# Altium schematic symbol library Electronic Devices_LIB.SchLib: 703 symbols (part 1 of 8) (continued)
## CAP_200pF_50V_NP0_0402
designator C?, comment Capacitance: 200pF  Voltage Rating: 50V  Case/Package: 0402  (hidden comment: GRM1555C1H201JA01D)
Cap Ceramic 200pF 50V C0G 5% Pad SMD 0402 125°C T/R; Manufacturer: Murata; Supplier 1: Digikey; Manufacturer Part Number: GRM1555C1H201JA01D; RoHS: Yes; Category: Ceramic Capacitors; Stock 1: 83426; Pricing 1: 1=0.1, 10=0.069, 50=0.041, 100=0.0323, 500=0.02388, 1000=0.01977, 2500=0.0184, 5000=0.01683 (USD); Mount: Surface Mount; Case Code (Metric): 1005; Case Code (Imperial): 0402; Min Operating Temperature: -55°C; Max Operating Temperature: 125°C; Tolerance: 5%; Packaging: Tape and Reel; Package Quantity: 1; Voltage Rating (DC): 50V; Dielectric: C0G; Termination: SMD/SMT; Voltage: 50V; Series: GRM; Construction: Flat; Length: 1mm; Width: 0.02inch; Height: 0.5mm; Thickness: 0.022inch; Depth: 0.5mm; Radiation Hardening: No; Lead Free: Lead Free; RoHS Compliant: Yes; ComponentLink1URL: https://datasheet.ciiva.com/131/product-131990.pdf?src-supplier=Digikey; ComponentLink1Description: https://datasheet.ciiva.com/131/product-131990.pdf?src-supplier=Digikey; ComponentLink2URL: https://datasheet.ciiva.com/131/partnumbering-e-01-131991.pdf?src-supplier=Digikey; ComponentLink2Description: https://datasheet.ciiva.com/131/partnumbering-e-01-131991.pdf?src-supplier=Digikey; ComponentLink3URL: https://datasheet.ciiva.com/131/partnumbering-e-01-131992.pdf?src-supplier=Digikey; ComponentLink3Description: https://datasheet.ciiva.com/131/partnumbering-e-01-131992.pdf?src-supplier=Digikey; ComponentLink4URL: https://datasheet.ciiva.com/11605/product-11605146.pdf?src-supplier=Avnet; ComponentLink4Description: https://datasheet.ciiva.com/11605/product-11605146.pdf?src-supplier=Avnet; Supplier Part Number 1: 490-3232-1-ND
footprint CAP_0402_CAPC1005X05N (Chip Capacitor, 2-Leads, Body 1.00x0.50mm, IPC Medium Density)
pins: 1, 2

## CAP_220pF_50V_NP0_0603
designator C?, comment Voltage Rating: 50V  Capacitance: 220pF  Case/Package: 0603  (hidden comment: C0603C221J5GAC7411)
Multilayer Ceramic Capacitors MLCC - SMD/SMT 50V 220pF C0G 0603 5%; Manufacturer: KEMET; Supplier 1: Digikey; Manufacturer Part Number: C0603C221J5GAC7411; RoHS: Yes; Category: Ceramic Capacitors; Stock 1: 183512; Pricing 1: 1=0.1, 10=0.046, 50=0.0266, 100=0.0207, 500=0.01556, 1000=0.01222, 2500=0.01111, 5000=0.01022 (USD); Mount: Surface Mount; Dielectric Material: Ceramic; Min Operating Temperature: -55°C; Max Operating Temperature: 125°C; Tolerance: 5%; Packaging: Tape and Reel; Dielectric: C0G; Voltage Rating (DC): 50V; Series: SMD Comm C0G; Length: 1.6mm; Depth: 0.8mm; Radiation Hardening: No; Lead Free: Lead Free; RoHS Compliant: Yes; ComponentLink1URL: https://datasheet.octopart.com/C0603C221J5GAC7411-Kemet-datasheet-11795438.pdf?src-supplier=Arrow+Electronics; ComponentLink1Description: https://datasheet.octopart.com/C0603C221J5GAC7411-Kemet-datasheet-11795438.pdf?src-supplier=Arrow+Electronics; ComponentLink2URL: https://datasheet.octopart.com/C0603C221J5GAC7411-KEMET-datasheet-149535035.pdf?src-supplier=Farnell; ComponentLink2Description: https://datasheet.octopart.com/C0603C221J5GAC7411-KEMET-datasheet-149535035.pdf?src-supplier=Farnell; ComponentLink3URL: https://api.kemet.com/component-edge/download/datasheet/C0603C221J5GAC7411.pdf?src-supplier=Digikey; ComponentLink3Description: https://api.kemet.com/component-edge/download/datasheet/C0603C221J5GAC7411.pdf?src-supplier=Digikey; ComponentLink4URL: https://datasheet.octopart.com/C0603C221J5GAC7411-Kemet-datasheet-5314449.pdf?src-supplier=Verical; ComponentLink4Description: https://datasheet.octopart.com/C0603C221J5GAC7411-Kemet-datasheet-5314449.pdf?src-supplier=Verical; ComponentLink5URL: https://datasheet.octopart.com/C0603C221J5GAC7411-KEMET-datasheet-157246123.pdf?src-supplier=Electro+Sonic; ComponentLink5Description: https://datasheet.octopart.com/C0603C221J5GAC7411-KEMET-datasheet-157246123.pdf?src-supplier=Electro+Sonic; Supplier Part Number 1: 399-C0603C221J5GAC7411CT-ND
footprint CAP_0603_CAPC1608X08N (Chip Capacitor, 2-Leads, Body 1.60x0.80mm, IPC Medium Density)
pins: 1, 2

## CAP_220uF_EEV227M025A9MAA
designator C?, comment Voltage Rating: 25V  Capacitance: 220uF  (hidden comment: EEV227M025A9MAA)
Cap Aluminum Lytic 220uF 25V 20% (8 X 10.2mm) SMD 600mA 2000h 105C T/R; Manufacturer: KEMET; ESR (Equivalent Series Resistance): 160mR; Supplier 1: Digikey; Manufacturer Part Number: EEV227M025A9MAA; RoHS: Yes; Category: Capacitors; Stock 1: 20821; Pricing 1: 1=0.58, 10=0.39, 50=0.3102, 100=0.2562 (USD); Mount: Surface Mount; Case/Package: Radial; Min Operating Temperature: -55°C; Max Operating Temperature: 105°C; Series: EEV; Packaging: Cut Tape; Tolerance: 20%; Impedance: 160mR; RoHS Compliant: Yes; ComponentLink1URL: https://datasheet.octopart.com/EEV227M025A9MAA-KEMET-datasheet-130072785.pdf?src-supplier=Farnell; ComponentLink1Description: https://datasheet.octopart.com/EEV227M025A9MAA-KEMET-datasheet-130072785.pdf?src-supplier=Farnell; Supplier Part Number 1: 399-18140-1-ND
footprint CAP_POL_220uF_CAPAE830X1050N
pins: 1, 2

## CAP_300pF_50V_NP0_0402
designator C?, comment Case Code (Imperial): 0402  Voltage Rating: 50V  Capacitance: 300pF  (hidden comment: GCM1555C1H301JA16D)
Cap Ceramic 300pF 50V C0G 5% SMD 0402 125°C Paper T/R; Manufacturer: Murata; Temperature Coefficient: 30ppm/°C; Supplier 1: Digikey; Manufacturer Part Number: GCM1555C1H301JA16D; RoHS: Yes; Category: Ceramic Capacitors; Stock 1: 94255; Pricing 1: 1=0.1, 10=0.049, 50=0.0334, 100=0.0287, 500=0.02068, 1000=0.0182, 2500=0.01557, 5000=0.01398 (USD); Mount: Surface Mount; Case/Package: 0402; Case Code (Metric): 1005; Material: Ceramic; Min Operating Temperature: -25°C; Max Operating Temperature: 125°C; Voltage Rating (DC): 50V; Tolerance: 5%; Packaging: Tape and Reel; Package Quantity: 10000; Dielectric: C0G; Termination: SMD/SMT; Series: GCM; Construction: Flat; Length: 1mm; Width: 0.5mm; Height: 0.5mm; Depth: 0.5mm; Ratings: AEC-Q200; Radiation Hardening: No; RoHS Compliant: Yes; ComponentLink1URL: https://datasheet.ciiva.com/11604/product-11604896.pdf?src-supplier=Avnet; ComponentLink1Description: https://datasheet.ciiva.com/11604/product-11604896.pdf?src-supplier=Avnet; ComponentLink2URL: https://datasheet.ciiva.com/164/s0717e-164794.pdf?src-supplier=Digikey; ComponentLink2Description: https://datasheet.ciiva.com/164/s0717e-164794.pdf?src-supplier=Digikey; Supplier Part Number 1: 490-GCM1555C1H301JA16DCT-ND
footprint CAP_0402_CAPC1005X05N (Chip Capacitor, 2-Leads, Body 1.00x0.50mm, IPC Medium Density)
pins: 1, 2

## CAP_560pF_50V_NP0_0402
designator C?, comment Voltage Rating: 50V  Case/Package: 0402  Capacitance: 560pF  (hidden comment: GRM1555C1H561JA01D)
Multilayer Ceramic Capacitor, 560 pF, 50 V, ï¿½ 5%, C0G (NP0), 0402 [1005 Metric]; Manufacturer: Murata; Temperature Coefficient: 30ppm/°C; Supplier 1: Digikey; Manufacturer Part Number: GRM1555C1H561JA01D; RoHS: Yes; Category: Ceramic Capacitors; Stock 1: 1316170; Pricing 1: 1=0.1, 10=0.039, 50=0.0268, 100=0.023, 500=0.01644, 1000=0.01441, 2500=0.01226, 5000=0.01096 (USD); Mount: Surface Mount; Case Code (Metric): 1005; Case Code (Imperial): 0402; Material: Ceramic; Min Operating Temperature: -55°C; Max Operating Temperature: 125°C; Package Quantity: 1; Tolerance: 5%; Packaging: Tape and Reel; Voltage Rating (DC): 50V; Dielectric: C0G; Termination: SMD/SMT; Voltage: 50V; Series: GRM; Construction: Flat; Length: 1mm; Width: 0.02inch; Height: 0.5mm; Thickness: 0.022inch; Depth: 0.5mm; Radiation Hardening: No; Reach SVHC Compliant: No; Lead Free: Lead Free; RoHS Compliant: Yes; ComponentLink1URL: https://datasheet.ciiva.com/131/product-131968.pdf?src-supplier=Digikey; ComponentLink1Description: https://datasheet.ciiva.com/131/product-131968.pdf?src-supplier=Digikey; ComponentLink2URL: https://datasheet.ciiva.com/18184/getdatasheetpartid-178878-18184424.pdf?src-supplier=Verical; ComponentLink2Description: https://datasheet.ciiva.com/18184/getdatasheetpartid-178878-18184424.pdf?src-supplier=Verical; ComponentLink3URL: https://datasheet.ciiva.com/11789/0900766b80ef921d-11789215.pdf?src-supplier=Rs; ComponentLink3Description: https://datasheet.ciiva.com/11789/0900766b80ef921d-11789215.pdf?src-supplier=Rs; ComponentLink4URL: https://datasheet.ciiva.com/14116/grmseries-tc-hitype-eng-14116839.pdf?src-supplier=Distrelec; ComponentLink4Description: https://datasheet.ciiva.com/14116/grmseries-tc-hitype-eng-14116839.pdf?src-supplier=Distrelec; Supplier Part Number 1: 490-3238-1-ND
footprint CAP_0402_CAPC1005X05N (Chip Capacitor, 2-Leads, Body 1.00x0.50mm, IPC Medium Density)
pins: 1, 2

## CAP_1000pF_50V_NP0_0402
designator C?, comment Voltage Rating: 50V  Capacitance: 1nF  Case Code (Imperial): 0402  (hidden comment: GRM1555C1H102JA01D)
Multilayer Ceramic Capacitor, 1000 pF, 50 V, ± 5%, C0G (NP0), 0402 [1005 Metric]; Manufacturer: Murata; Dielectric Material: 4241ConductorMaterial; Insulation Resistance: 10GR; Temperature Coefficient: 30ppm/°C; Supplier 1: Digi-Key; Manufacturer Part Number: GRM1555C1H102JA01D; RoHS: Yes; Category: Ceramic Capacitors; Stock 1: 22370735; Pricing 1: 1=0.1, 10=0.032, 50=0.0186, 100=0.0144, 500=0.01086, 1000=0.00853, 2500=0.00776, 5000=0.00714 (USD); Mount: Surface Mount; Case/Package: 0402; Number of Pins: 2; Case Code (Metric): 1005; Material: Ceramic; Min Operating Temperature: -55°C; Max Operating Temperature: 125°C; Package Quantity: 1; Tolerance: 5%; Packaging: Tape and Reel; Voltage Rating (DC): 50V; Dielectric: C0G; Termination: SMD/SMT; Voltage: 50V; Series: GRM; Construction: Flat; Length: 1mm; Width: 0.5mm; Height: 0.5mm; Thickness: 0.022inch; Depth: 0.5mm; Size: 0.5mm; Radiation Hardening: No; Reach SVHC Compliant: No; RoHS Compliant: Yes; Lead Free: 5697LeadFree; ComponentLink1URL: https://datasheet.ciiva.com/34302/1855908-34302849.pdf?src-supplier=Jameco; ComponentLink1Description: https://datasheet.ciiva.com/34302/1855908-34302849.pdf?src-supplier=Jameco; ComponentLink2URL: https://datasheet.ciiva.com/132/product-132800.pdf?src-supplier=Digi-Key; ComponentLink2Description: https://datasheet.ciiva.com/132/product-132800.pdf?src-supplier=Digi-Key; ComponentLink3URL: https://datasheet.ciiva.com/132/grm1555c1h102ja01-01-132799.pdf?src-supplier=Digi-Key; ComponentLink3Description: https://datasheet.ciiva.com/132/grm1555c1h102ja01-01-132799.pdf?src-supplier=Digi-Key; ComponentLink4URL: https://datasheet.ciiva.com/18184/getdatasheetpartid-90260-18184180.pdf?src-supplier=Verical; ComponentLink4Description: https://datasheet.ciiva.com/18184/getdatasheetpartid-90260-18184180.pdf?src-supplier=Verical; ComponentLink5URL: https://datasheet.ciiva.com/7828/4360-7828821.pdf?src-supplier=Element14; ComponentLink5Description: https://datasheet.ciiva.com/7828/4360-7828821.pdf?src-supplier=Element14; ComponentLink6URL: https://datasheet.ciiva.com/14116/grmseries-tc-hitype-eng-14116858.pdf?src-supplier=Distrelec; ComponentLink6Description: https://datasheet.ciiva.com/14116/grmseries-tc-hitype-eng-14116858.pdf?src-supplier=Distrelec; ComponentLink7URL: https://datasheet.ciiva.com/132/grm1555c1h102ja01-01-132801.pdf?src-supplier=Digi-Key; ComponentLink7Description: https://datasheet.ciiva.com/132/grm1555c1h102ja01-01-132801.pdf?src-supplier=Digi-Key; Supplier Part Number 1: 490-3244-1-ND
footprint CAP_0402_CAPC1005X05N (Chip Capacitor, 2-Leads, Body 1.00x0.50mm, IPC Medium Density)
pins: 1, 2

## CAP_1000pF_100V_NP0_0603
designator C?, comment Capacitance: 1nF  Voltage Rating (DC): 100V  Case/Package: 0603  (hidden comment: GRM1885C2A102JA01J)
0603 1000 pF 100 V ±5% Tolerance C0G/NP0 Multilayer Ceramic Capacitor; Manufacturer: Murata; Dielectric: C0G; Supplier 1: Mouser; Manufacturer Part Number: GRM1885C2A102JA01J; RoHS: Yes; Category: Ceramic Capacitors; Stock 1: 27826; Pricing 1: 1=0.1, 10=0.03, 50=0.03, 100=0.018, 1000=0.014, 10000=0.009 (USD); Mount: Surface Mount; Case Code (Metric): 1608; Case Code (Imperial): 0603; Min Operating Temperature: -55°C; Max Operating Temperature: 125°C; Packaging: Tape and Reel; Termination: SMD/SMT; Series: GRM; Package Quantity: 1; Voltage Rating: 100V; Tolerance: 5%; Construction: Flat; Length: 1.6mm; Width: 0.031inch; Height: 0.8mm; Thickness: 0.035inch; Depth: 0.8mm; Radiation Hardening: No; RoHS Compliant: Yes; ComponentLink1URL: https://datasheet.ciiva.com/166/product-166130.pdf?src-supplier=Digi-Key; ComponentLink1Description: https://datasheet.ciiva.com/166/product-166130.pdf?src-supplier=Digi-Key; ComponentLink2URL: https://datasheet.ciiva.com/29540/grm1885c2a102ja01-01-29540423.pdf?src-supplier=Digi-Key; ComponentLink2Description: https://datasheet.ciiva.com/29540/grm1885c2a102ja01-01-29540423.pdf?src-supplier=Digi-Key; ComponentLink3URL: https://datasheet.ciiva.com/29540/grm1885c2a102ja01-01-29540424.pdf?src-supplier=Digi-Key; ComponentLink3Description: https://datasheet.ciiva.com/29540/grm1885c2a102ja01-01-29540424.pdf?src-supplier=Digi-Key; ComponentLink4URL: https://datasheet.ciiva.com/29540/grm1885c2a102ja01-01-29540425.pdf?src-supplier=Digi-Key; ComponentLink4Description: https://datasheet.ciiva.com/29540/grm1885c2a102ja01-01-29540425.pdf?src-supplier=Digi-Key; ComponentLink5URL: https://datasheet.ciiva.com/5423/product-5423321.pdf?src-supplier=Mouser; ComponentLink5Description: https://datasheet.ciiva.com/5423/product-5423321.pdf?src-supplier=Mouser; Supplier Part Number 1: 81-GRM1885C2A102JA1J
footprint CAP_0603_CAPC1608X08N (Chip Capacitor, 2-Leads, Body 1.60x0.80mm, IPC Medium Density)
pins: 1, 2

## CAP_1000pF_100V_NP0_0805
designator C?, comment Case Code (Imperial): 0805  Voltage Rating: 100V  Capacitance: 1.5nF  (hidden comment: GRM2165C2A152JA01D)
Cap Ceramic 0.0015uF 100V C0G 5% SMD 0805 125°C Paper T/R; Manufacturer: Murata; Supplier 1: Digikey; Manufacturer Part Number: GRM2165C2A152JA01D; RoHS: Yes; Category: Ceramic Capacitors; Stock 1: 17807; Pricing 1: 1=0.11, 10=0.063, 50=0.0432, 100=0.0372, 500=0.02714, 1000=0.02399 (USD); Mount: Surface Mount; Case/Package: 0805; Case Code (Metric): 2012; Min Operating Temperature: -55°C; Max Operating Temperature: 125°C; Package Quantity: 4000; Tolerance: 5%; Packaging: Tape and Reel; Voltage Rating (DC): 100V; Dielectric: C0G; Termination: SMD/SMT; Series: GRM; Construction: Flat; Length: 2mm; Width: 0.049inch; Height: 0.6mm; Thickness: 0.028inch; Depth: 1.25mm; Radiation Hardening: No; RoHS Compliant: Yes; ComponentLink1URL: https://datasheet.ciiva.com/11621/product-11621227.pdf?src-supplier=Avnet; ComponentLink1Description: https://datasheet.ciiva.com/11621/product-11621227.pdf?src-supplier=Avnet; ComponentLink2URL: https://datasheet.ciiva.com/166/partnumbering-e-01-166981.pdf?src-supplier=Digikey; ComponentLink2Description: https://datasheet.ciiva.com/166/partnumbering-e-01-166981.pdf?src-supplier=Digikey; Supplier Part Number 1: 490-11552-1-ND
footprint CAP_0805_CAPC2012X12N (Chip Capacitor, 2-Leads, Body 2.00x1.25mm, IPC Medium Density)
pins: 1, 2

## CAP_2200pF_16V_X7R_0201
designator C?, comment Voltage Rating: 16V  Capacitance: 2.2nF  Case/Package: 0201  Supplier Part Number 2: 399-18140-1-ND  (hidden comment: GRM033R71C222KA88D)
Cap Aluminum Lytic 220uF 25V 20% (8 X 10.2mm) SMD 600mA 2000h 105C T/R; Manufacturer: Murata; Material: Ceramic; Tolerance: 10%; Dielectric: X7R; ESR (Equivalent Series Resistance): 160mR; Supplier 1: Digikey; Manufacturer Part Number: GRM033R71C222KA88D; RoHS: Yes; Category: Ceramic Capacitors; Stock 1: 653022; Pricing 1: 1=0.1, 10=0.01, 50=0.0056, 100=0.0043, 500=0.00324, 1000=0.00255, 2500=0.00232, 5000=0.00213 (USD); Mount: Surface Mount; Case Code (Metric): 0603; Case Code (Imperial): 0201; Min Operating Temperature: -55°C; Max Operating Temperature: 125°C; Package Quantity: 1; Packaging: Tape and Reel; Voltage Rating (DC): 16V; Termination: SMD/SMT; Voltage: 16V; Series: GRM; Construction: Flat; Length: 0.6mm; Width: 0.012inch; Height: 0.3mm; Thickness: 0.013inch; Depth: 0.3mm; Radiation Hardening: No; Reach SVHC Compliant: No; Lead Free: Lead Free; RoHS Compliant: Yes; ComponentLink1URL: https://datasheet.ciiva.com/130/grm033r71c222ka88-01-130159.pdf?src-supplier=Digikey; ComponentLink1Description: https://datasheet.ciiva.com/130/grm033r71c222ka88-01-130159.pdf?src-supplier=Digikey; ComponentLink2URL: https://datasheet.ciiva.com/130/grm033r71c222ka88-01-130158.pdf?src-supplier=Digikey; ComponentLink2Description: https://datasheet.ciiva.com/130/grm033r71c222ka88-01-130158.pdf?src-supplier=Digikey; ComponentLink3URL: https://datasheet.ciiva.com/130/product-130160.pdf?src-supplier=Digikey; ComponentLink3Description: https://datasheet.ciiva.com/130/product-130160.pdf?src-supplier=Digikey; ComponentLink4URL: https://datasheet.ciiva.com/18184/getdatasheetpartid-153132-18184090.pdf?src-supplier=Verical; ComponentLink4Description: https://datasheet.ciiva.com/18184/getdatasheetpartid-153132-18184090.pdf?src-supplier=Verical; ComponentLink5URL: https://datasheet.ciiva.com/29199/455766-da-01-en-vs-kondensator-0201-29199161.pdf?src-supplier=Conrad; ComponentLink5Description: https://datasheet.ciiva.com/29199/455766-da-01-en-vs-kondensator-0201-29199161.pdf?src-supplier=Conrad; ComponentLink6URL: https://datasheet.ciiva.com/11620/product-11620555.pdf?src-supplier=Avnet; ComponentLink6Description: https://datasheet.ciiva.com/11620/product-11620555.pdf?src-supplier=Avnet; Supplier Part Number 1: 490-3190-1-ND; Supplier 2: Digikey; Stock 2: 20821; Pricing 2: 1=0.58, 10=0.39, 50=0.3102, 100=0.2562 (USD); Impedance: 160mR; ComponentLink7URL: https://datasheet.octopart.com/EEV227M025A9MAA-KEMET-datasheet-130072785.pdf?src-supplier=Farnell; ComponentLink7Description: https://datasheet.octopart.com/EEV227M025A9MAA-KEMET-datasheet-130072785.pdf?src-supplier=Farnell
footprint CAP_0201_CAPC0603X03N (Chip Capacitor, 2-Leads, Body 0.60x0.30mm, IPC Medium Density)
pins: 1, 2

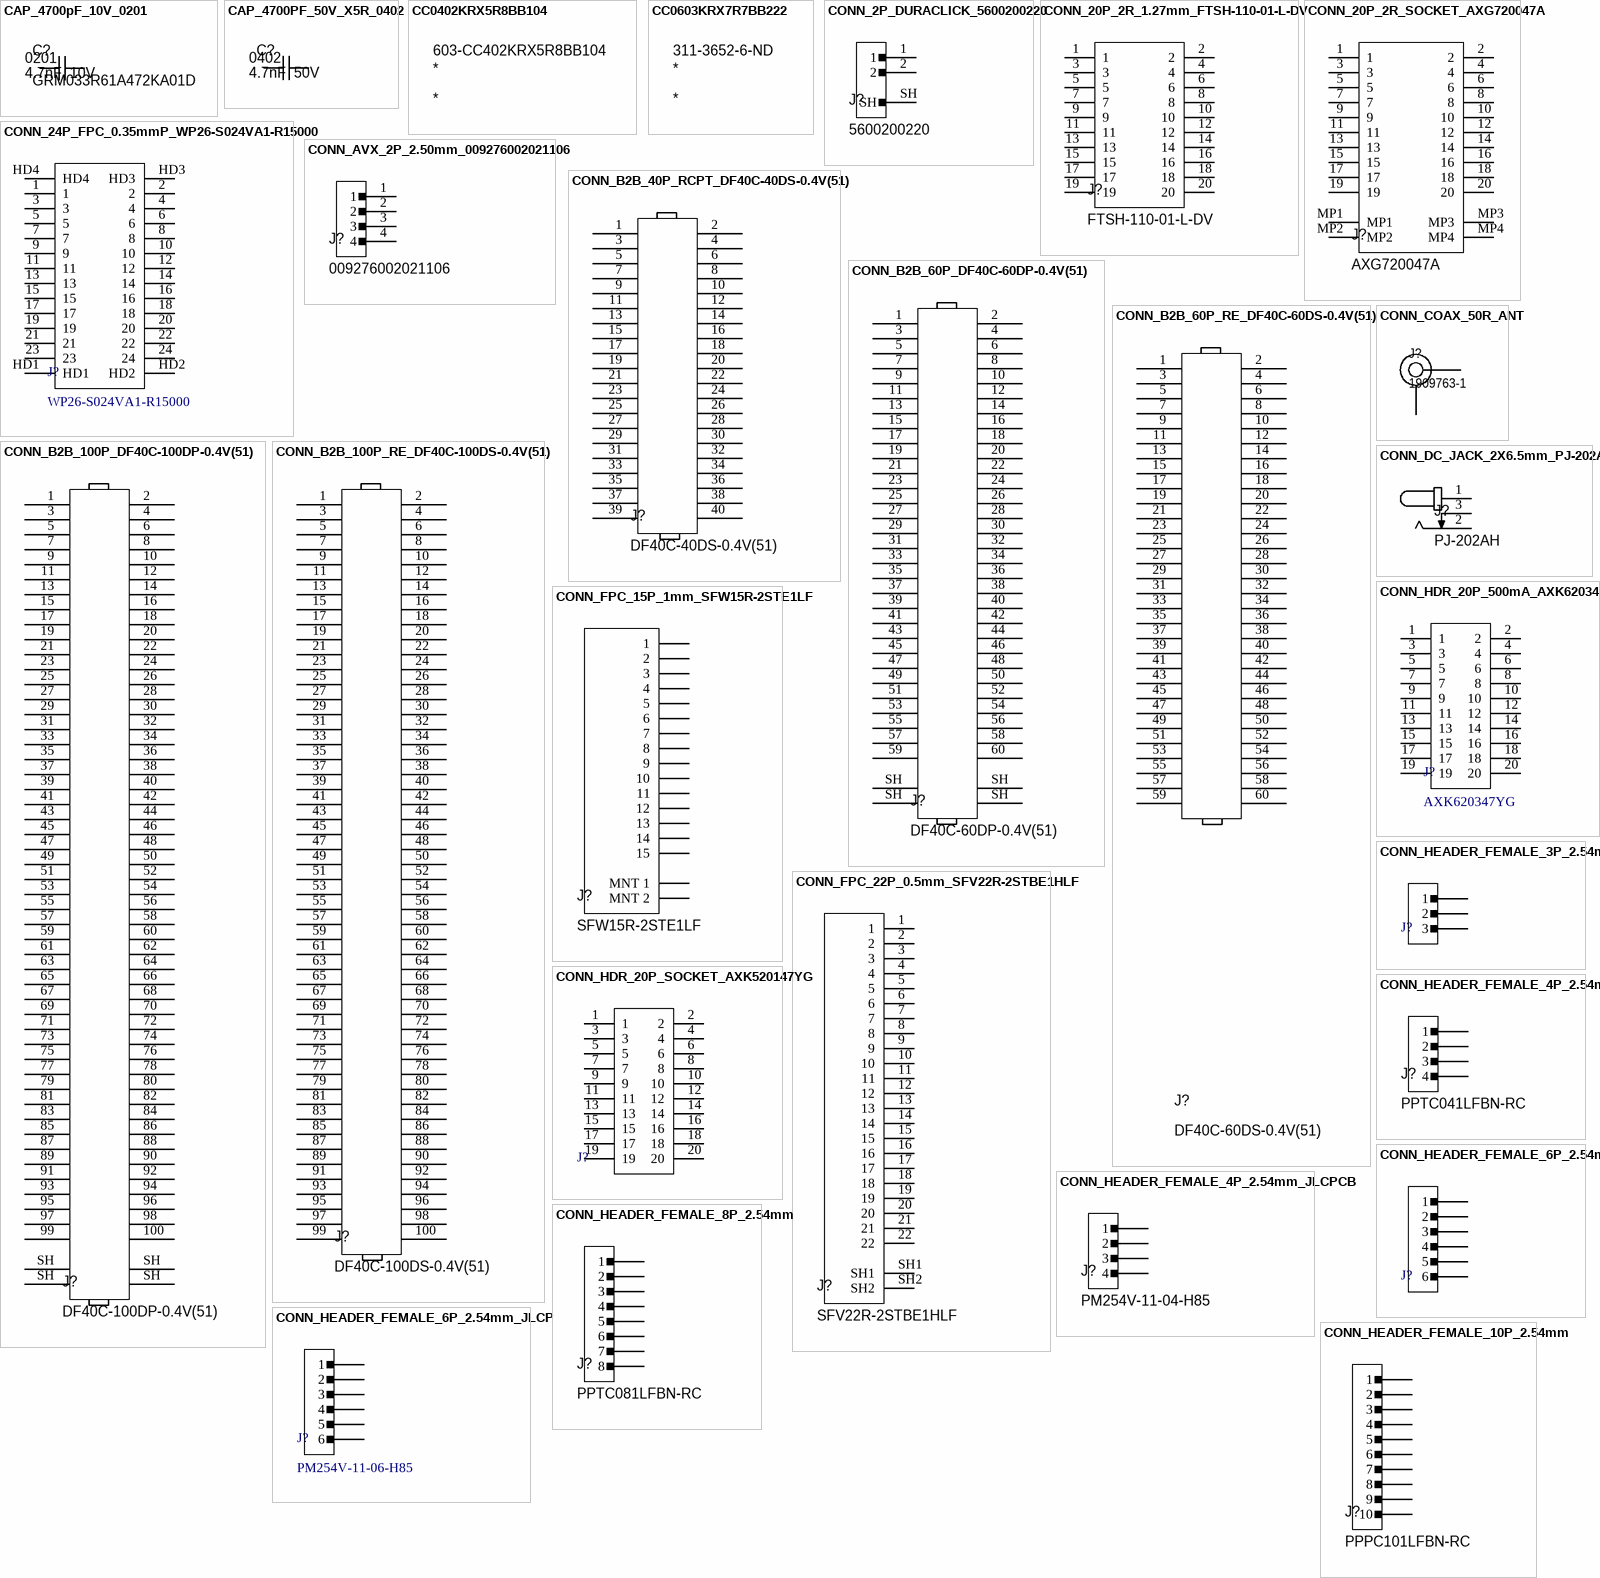
[diagram p3: symbols CAP_4700pF_10V_0201 to CONN_HEADER_FEMALE_10P_2.54mm]

## CAP_4700pF_10V_0201
designator C?, comment GRM033R61A472KA01D  Voltage Rating: 10V  Capacitance: 4.7nF  Case/Package: 0201
Multilayer Ceramic Capacitor, 4700 pF, 10 V, ± 10%, X5R, 0201 [0603 Metric]; Manufacturer: Murata; Dissipation Factor: 0.035%; Insulation Resistance: 10GR; Supplier 1: Digi-Key; Manufacturer Part Number: GRM033R61A472KA01D; RoHS: Yes; Category: Ceramic Capacitors; Stock 1: 417847; Pricing 1: 1=0.1, 10=0.01, 50=0.0054, 100=0.0042, 500=0.00318, 1000=0.0025, 2500=0.00227, 5000=0.00209 (USD); Mount: Surface Mount; Case Code (Metric): 0603; Case Code (Imperial): 0201; Min Operating Temperature: -55°C; Max Operating Temperature: 85°C; Package Quantity: 1; Tolerance: 10%; Packaging: Tape and Reel; Voltage Rating (DC): 10V; Dielectric: X5R; Termination: SMD/SMT; Series: GRM; Construction: Flat; Length: 0.6mm; Width: 0.012inch; Height: 0.3mm; Thickness: 0.013inch; Depth: 0.3mm; Radiation Hardening: No; Lead Free: Lead Free; RoHS Compliant: Yes; ComponentLink1URL: https://datasheet.ciiva.com/130/product-130016.pdf?src-supplier=Digi-Key; ComponentLink1Description: https://datasheet.ciiva.com/130/product-130016.pdf?src-supplier=Digi-Key; ComponentLink2URL: https://datasheet.ciiva.com/16206/product-16206957.pdf?src-supplier=Future+Electronics; ComponentLink2Description: https://datasheet.ciiva.com/16206/product-16206957.pdf?src-supplier=Future+Electronics; Supplier Part Number 1: 490-3164-1-ND
footprint CAP_0201_CAPC0603X03N (Chip Capacitor, 2-Leads, Body 0.60x0.30mm, IPC Medium Density)
pins: 1, 2

## CAP_4700PF_50V_X5R_0402
designator C?, comment Voltage Rating: 50V  Capacitance: 4.7nF  Case/Package: 0402  (hidden comment: GRM155R61H472KA01D)
Multilayer Ceramic Capacitor, 100 uF, 16 V, ± 20%, X5R, 1210 [3225 Metric]; Manufacturer: Murata; Tolerance: 10%; Material: 4241ConductorMaterial; Supplier 1: Digikey; Manufacturer Part Number: GRM155R61H472KA01D; RoHS: Yes; Category: Ceramic Capacitors; Stock 1: 61974; Pricing 1: 1=0.1, 10=0.029, 50=0.0166, 100=0.0129, 500=0.00974, 1000=0.00765, 2500=0.00695, 5000=0.0064 (USD); Mount: Surface Mount; Case Code (Metric): 1005; Case Code (Imperial): 0402; Min Operating Temperature: -55°C; Max Operating Temperature: 85°C; Packaging: Tape and Reel; Package Quantity: 10000; Voltage Rating (DC): 50V; Dielectric: X5R; Termination: SMD/SMT; Series: GRM; Construction: Flat; Length: 1mm; Width: 0.02inch; Height: 0.5mm; Thickness: 0.022inch; Depth: 0.5mm; Radiation Hardening: No; RoHS Compliant: Yes; ComponentLink1URL: https://datasheet.ciiva.com/6263/product-6263668.pdf?src-supplier=Digikey; ComponentLink1Description: https://datasheet.ciiva.com/6263/product-6263668.pdf?src-supplier=Digikey; ComponentLink2URL: https://datasheet.ciiva.com/6263/partnumbering-e-01-6263670.pdf?src-supplier=Digikey; ComponentLink2Description: https://datasheet.ciiva.com/6263/partnumbering-e-01-6263670.pdf?src-supplier=Digikey; ComponentLink3URL: https://datasheet.ciiva.com/11620/product-11620407.pdf?src-supplier=Avnet; ComponentLink3Description: https://datasheet.ciiva.com/11620/product-11620407.pdf?src-supplier=Avnet; ComponentLink4URL: https://datasheet.ciiva.com/6263/partnumbering-e-01-6263672.pdf?src-supplier=Digikey; ComponentLink4Description: https://datasheet.ciiva.com/6263/partnumbering-e-01-6263672.pdf?src-supplier=Digikey; Supplier Part Number 1: 490-6317-1-ND; Supplier 2: Digikey; Stock 2: 503358; Pricing 2: 1=1.73, 10=1.295, 50=1.1816, 100=0.9681 (USD); Reach SVHC Compliant: No; ComponentLink5URL: http://www.farnell.com/datasheets/1497285.pdf?src-supplier=Farnell; ComponentLink5Description: http://www.farnell.com/datasheets/1497285.pdf?src-supplier=Farnell; Supplier Part Number 2: 587-3152-1-ND
footprint CAP_0402_CAPC1005X05N (Chip Capacitor, 2-Leads, Body 1.00x0.50mm, IPC Medium Density)
pins: 1, 2

## CC0402KRX5R8BB104
designator *  Supplier Part Number 1: 603-CC402KRX5R8BB104
Multilayer Ceramic Capacitor, 0.1 uF, 16 V, ± 10%, X7R, 0402 [1005 Metric]; Manufacturer: Yageo; Manufacturer Part Number: CC0402KRX5R8BB104; Voltage Rating: 25V; Capacitance: 100nF; Dielectric: X5R; Temperature Coefficient: 30ppm/°C; Supplier 1: Mouser; RoHS: Yes; Category: Ceramic Capacitors; Stock 1: 987; Pricing 1: 1=0.1, 10=0.021, 50=0.021, 100=0.013, 1000=0.01, 10000=0.005 (USD); Mount: Surface Mount; Case/Package: 0402; Case Code (Metric): 1005; Case Code (Imperial): 0402; Material: 4241ConductorMaterial; Min Operating Temperature: -55°C; Max Operating Temperature: 85°C; Tolerance: 10%; Packaging: Tape and Reel; Voltage Rating (DC): 25V; Series: CC; RoHS Compliant: Yes; Lead Free: 5697LeadFree; Halogen Free: 5694HalogenFree; ComponentLink1URL: http://www.mouser.com/ds/2/447/UPY-GPHC_X5R_4V-to-50V_25-1131599.pdf?src-supplier=Mouser; ComponentLink1Description: http://www.mouser.com/ds/2/447/UPY-GPHC_X5R_4V-to-50V_25-1131599.pdf?src-supplier=Mouser; ComponentLink2URL: https://datasheet.octopart.com/CC0402KRX5R8BB104-Yageo-datasheet-137700082.pdf?src-supplier=Future+Electronics; ComponentLink2Description: https://datasheet.octopart.com/CC0402KRX5R8BB104-Yageo-datasheet-137700082.pdf?src-supplier=Future+Electronics; ComponentLink3URL: http://www.yageo.com/documents/recent/UPY-GPHC_X5R_4V-to-50V_25.pdf?src-supplier=Digikey; ComponentLink3Description: http://www.yageo.com/documents/recent/UPY-GPHC_X5R_4V-to-50V_25.pdf?src-supplier=Digikey; ComponentLink4URL: https://datasheet.octopart.com/CC0402KRX5R8BB104-Yageo-datasheet-140260304.pdf?src-supplier=Newark; ComponentLink4Description: https://datasheet.octopart.com/CC0402KRX5R8BB104-Yageo-datasheet-140260304.pdf?src-supplier=Newark; ComponentLink5URL: https://datasheet.octopart.com/CC0402KRX5R8BB104-Yageo-datasheet-170350636.pdf?src-supplier=Future+Electronics; ComponentLink5Description: https://datasheet.octopart.com/CC0402KRX5R8BB104-Yageo-datasheet-170350636.pdf?src-supplier=Future+Electronics; ComponentLink6URL: http://www.yageo.com/documents/recent/UPY-GPHC_X5R_4V-to-50V-16.pdf?src-supplier=Future+Electronics; ComponentLink6Description: http://www.yageo.com/documents/recent/UPY-GPHC_X5R_4V-to-50V-16.pdf?src-supplier=Future+Electronics

## CC0603KRX7R7BB222
designator *  Supplier Part Number 1: 311-3652-6-ND
Multilayer Ceramic Capacitor, 2200 pF, 16 V, ± 10%, X7R, 0603 [1608 Metric]; Manufacturer: Yageo; Manufacturer Part Number: CC0603KRX7R7BB222; Capacitance: 2.2nF; Voltage Rating (DC): 16V; Supplier 1: Digikey; RoHS: Yes; Category: Ceramic Capacitors; Stock 1: 107118; Pricing 1: 1=0.1, 10=0.046, 50=0.0262, 100=0.0203, 500=0.01528, 1000=0.012 (USD); Case/Package: 0603; Material: 4241ConductorMaterial; Min Operating Temperature: -55°C; Max Operating Temperature: 125°C; Tolerance: 10%; Packaging: Tape and Reel; Voltage Rating: 16V; Dielectric: X7R; Series: CC; Lead Free: Lead Free; Halogen Free: Halogen Free; RoHS Compliant: Yes; ComponentLink1URL: http://www.mouser.com/ds/2/447/Yageo_UPY-GP_NP0_16V-to-50V_9-358835.pdf?src-supplier=Mouser; ComponentLink1Description: http://www.mouser.com/ds/2/447/Yageo_UPY-GP_NP0_16V-to-50V_9-358835.pdf?src-supplier=Mouser; ComponentLink2URL: https://datasheet.octopart.com/CC0603KRX7R7BB222-Yageo-datasheet-137700082.pdf?src-supplier=Future+Electronics; ComponentLink2Description: https://datasheet.octopart.com/CC0603KRX7R7BB222-Yageo-datasheet-137700082.pdf?src-supplier=Future+Electronics; ComponentLink3URL: http://www.yageo.com/documents/recent/UPY-GPHC_X7R_6.3V-to-50V_9.pdf?src-supplier=Future+Electronics; ComponentLink3Description: http://www.yageo.com/documents/recent/UPY-GPHC_X7R_6.3V-to-50V_9.pdf?src-supplier=Future+Electronics; ComponentLink4URL: https://datasheet.octopart.com/CC0603KRX7R7BB222-Yageo-datasheet-151948686.pdf?src-supplier=Farnell; ComponentLink4Description: https://datasheet.octopart.com/CC0603KRX7R7BB222-Yageo-datasheet-151948686.pdf?src-supplier=Farnell; ComponentLink5URL: http://www.yageo.com/documents/recent/UPY-GPHC_X7R_6.3V-to-50V_18.pdf?src-supplier=Digikey; ComponentLink5Description: http://www.yageo.com/documents/recent/UPY-GPHC_X7R_6.3V-to-50V_18.pdf?src-supplier=Digikey; ComponentLink6URL: https://datasheet.octopart.com/CC0603KRX7R7BB222-Yageo-datasheet-147453679.pdf?src-supplier=Newark; ComponentLink6Description: https://datasheet.octopart.com/CC0603KRX7R7BB222-Yageo-datasheet-147453679.pdf?src-supplier=Newark

## CONN_2P_DURACLICK_5600200220
designator J?, comment 5600200220
DuraClik Wire-to-Board Header, Single Row, Vertical, 2 Circuits, Tin (Sn) Over Nickel, Natural; Manufacturer: Molex; Number of Circuits: 2; Gender: Male; Current Rating: 3A; Voltage Rating: 125V; Pitch: 2mm; Glow Wire Compliant: Non-compliant; Supplier 1: Digikey; Manufacturer Part Number: 5600200220; RoHS: Yes; Category: Headers and Wire Housings; Stock 1: 66363; Pricing 1: 1=0.62, 10=0.514, 100=0.4284 (USD); Contact Plating: Tin; Contact Material: Copper Alloy; Min Operating Temperature: -40°C; Max Operating Temperature: 125°C; Number of Rows: 1; Termination: Solder; Number of Contacts: 2; Orientation: Vertical; Height: 8.2mm; Reach SVHC Compliant: Unknown; Supplier Part Number 1: WM10862CT-ND
footprint CONN_2P_DURACLICK_5600200220
pins: 1, 2, SH

## CONN_20P_2R_1.27mm_FTSH-110-01-L-DV
designator J?, comment FTSH-110-01-L-DV
Conn Unshrouded Header HDR 20 POS 1.27mm Solder ST Top Entry SMD Tube; Manufacturer: Samtec; Number of Contacts: 20; Gender: Male; Max Current Rating: 1.75A; Row Spacing: 0.05inch; Supplier 1: Digikey; Manufacturer Part Number: FTSH-110-01-L-DV; RoHS: Yes; Category: Headers and Wire Housings; Stock 1: 1063; Pricing 1: 1=3.68, 10=3.345, 100=2.9469, 500=2.5049, 1000=2.13653, 5000=1.94304 (USD); Mount: Surface Mount; Contact Material: Bronze; Contact Plating: Gold; Housing Color: Black; Housing Material: Polymer; Color: Black; Min Operating Temperature: -55°C; Max Operating Temperature: 125°C; Number of Rows: 2; Termination: Solder; Packaging: Rail/Tube; Number of Positions: 20; Series: FTSH; Contact Type: Male Pin; Orientation: Straight; Package Quantity: 1; Current Rating: 1.75A; Length: 12.7mm; Pitch: 1.27mm; Depth: 3.43mm; Contact Mating Length: 0.12inch; Lead Free: Lead Free; RoHS Compliant: Yes; Reach SVHC Compliant: No; ComponentLink1URL: https://datasheet.ciiva.com/25616/0900766b81142f81-25616972.pdf?src-supplier=Rs; ComponentLink1Description: https://datasheet.ciiva.com/25616/0900766b81142f81-25616972.pdf?src-supplier=Rs; ComponentLink2URL: https://datasheet.ciiva.com/6867/ftsh-1xx-xx-xxx-dv-xxx-mkt-6867431.pdf?src-supplier=Digikey; ComponentLink2Description: https://datasheet.ciiva.com/6867/ftsh-1xx-xx-xxx-dv-xxx-mkt-6867431.pdf?src-supplier=Digikey; Supplier Part Number 1: SAM1161-10-ND
footprint CONN_20P_2R_SAMTEC_FTSH-110-X-X-DV
pins: 1, 2, 3, 4, 5, 6, 7, 8, 9, 10, 11, 12, 13, 14, 15, 16, 17, 18, 19, 20

## CONN_20P_2R_SOCKET_AXG720047A
designator J?, comment AXG720047A
A35US Series Dual Row 20 Position 0.35 mm Power Terminal Socket Connector; Manufacturer: Panasonic; Number of Positions: 20; Mated Stacking Heights: 0.6mm; Pitch: 0.014inch; Supplier 1: Arrow Electronics; Manufacturer Part Number: AXG720047A; RoHS: Yes; Category: Connectors; Stock 1: 225; Pricing 1: 1=1.3058, 10=1.2199, 25=1.1394, 50=1.1068 (USD); Mount: Surface Mount; Contact Plating: Gold; Packaging: Cut Strip; Number of Rows: 2; Series: A35US; ComponentLink1URL: https://media.digikey.com/pdf/Data%20Sheets/Panasonic%20Electric%20Works%20PDFs/AXG(7,8)_A35US_Series_DS.pdf?src-supplier=Digikey; ComponentLink1Description: https://media.digikey.com/pdf/Data%20Sheets/Panasonic%20Electric%20Works%20PDFs/AXG(7,8)_A35US_Series_DS.pdf?src-supplier=Digikey; Supplier Part Number 1: AXG720047A
footprint CONN_20P_2R_AXG720047
pins: 1, 2, 3, 4, 5, 6, 7, 8, 9, 10, 11, 12, 13, 14, 15, 16, 17, 18, 19, 20, MP1, MP2, MP3, MP4

## CONN_24P_FPC_0.35mmP_WP26-S024VA1-R15000
designator J?, comment WP26-S024VA1-R15000
Conn Rcpt 24POS SMD Gold; Manufacturer: JAE Electronics; Connector Type: Receptacle; Number of Positions: 24; Mated Stacking Heights: 0.6mm; RoHS: No; Stock 1: 9869; Pricing 1: 1=1,16000, 10=0,97800, 25=0,93760, 50=0,91760, 100=0,87780, 250=0,79800, 500=0,71820, 1000=0,63840, 2500=0,57855 (USD); Mount: Surface Mount; Contact Plating: Gold; Packaging: Tape and Reel; Number of Rows: 2; ComponentLink1URL: http://www.jae.com/z-en/pdf_download_exec.cfm?param=MB-0307-1E_WP26.pdf&src-supplier=Digi-Key; ComponentLink1Description: http://www.jae.com/z-en/pdf_download_exec.cfm?param=MB-0307-1E_WP26.pdf&src-supplier=Digi-Key; ComponentLink2URL: https://www.jae.com/direct/topics/topics_file_download/?topics_id=66837&amp;ext_no=04&amp;_lang=en&src-supplier=Digi-Key; ComponentLink2Description: https://www.jae.com/direct/topics/topics_file_download/?topics_id=66837&amp;ext_no=04&amp;_lang=en&src-supplier=Digi-Key; Manufacturer Part Number: WP26-S024VA1-R15000; Category: Connectors; Supplier 1: Digi-Key; Supplier Part Number 1: 670-2930-6-ND; Supplier 2: Mouser; Supplier Part Number 2: 656-WP26-S024VA1
footprint CONN_FPC_WP26S024VA1R15000 (0.014" (0.35mm) PITCH)
pins: 1, 2, 3, 4, 5, 6, 7, 8, 9, 10, 11, 12, 13, 14, 15, 16, 17, 18, 19, 20, 21, 22, 23, 24, HD1, HD2, HD3, HD4

## CONN_AVX_2P_2.50mm_009276002021106
designator J?, comment 009276002021106
CONN TERM BLOCK 2 POS WTB; Manufacturer: Kyocera AVX; Supplier 1: Digi-Key; Manufacturer Part Number: 009276002021106; RoHS: No; Stock 1: 16014; Pricing 1: 1=0.77, 10=0.646, 100=0.5804, 500=0.47486 (USD); Supplier Part Number 1: 478-6169-6-ND
footprint CONN_AVX_009276002021006 (Pitch 2.50mm)
pins: 1, 2, 3, 4

## CONN_B2B_40P_RCPT_DF40C-40DS-0.4V(51)
designator J?, comment DF40C-40DS-0.4V(51)
Conn Board to Board RCP 40 POS 0.4mm Solder ST SMD T/R / CONN RCPT 40POS .4MM VERT SMD; Manufacturer: Hirose; Current Rating: 300mA; Gender: Female; Number of Positions: 40; Voltage Rating: 30V; Connector Type: Receptacle; Mated Stacking Heights: 1.5mm; Supplier 1: Digikey; Manufacturer Part Number: DF40C-40DS-0.4V(51); RoHS: Yes; Category: Board to Board Connectors; Stock 1: 4160; Pricing 1: 1=0.94, 10=0.792, 25=0.7596, 50=0.7434, 100=0.711, 250=0.6464, 500=0.58176, 1000=0.51712, 2500=0.46864 (USD); Mount: Surface Mount; Contact Plating: Gold; Contact Material: Bronze; Housing Material: Polymer; Min Operating Temperature: -35°C; Max Operating Temperature: 85°C; Package Quantity: 5000; Number of Rows: 2; Packaging: Tape and Reel; Termination: SMD/SMT; Number of Contacts: 40; Series: DF40; Orientation: Straight; Pitch: 0.4mm; Radiation Hardening: No; RoHS Compliant: Yes; Reach SVHC Compliant: No; Lead Free: Lead Free; ComponentLink1URL: https://datasheet.ciiva.com/11747/0900766b80e0bfd2-11747870.pdf?src-supplier=Rs; ComponentLink1Description: https://datasheet.ciiva.com/11747/0900766b80e0bfd2-11747870.pdf?src-supplier=Rs; ComponentLink2URL: https://datasheet.ciiva.com/46408/1824826-46408904.pdf?src-supplier=Element14; ComponentLink2Description: https://datasheet.ciiva.com/46408/1824826-46408904.pdf?src-supplier=Element14; Supplier Part Number 1: H11625CT-ND
footprint CONN_B2B_RCPT_40P_Hirose_0_MFG
pins: 1, 2, 3, 4, 5, 6, 7, 8, 9, 10, 11, 12, 13, 14, 15, 16, 17, 18, 19, 20, 21, 22, 23, 24, 25, 26, 27, 28, 29, 30, 31, 32, 33, 34, 35, 36, 37, 38, 39, 40

## CONN_B2B_60P_DF40C-60DP-0.4V(51)
designator J?, comment DF40C-60DP-0.4V(51)
Board-to-Board Connector with 0.4-mm Pitch, 1.5 - 4.0-mm Height - DF40 Series (HIROSE ELECTRIC); Voltage Rating: 30V; Current Rating: 300mA; Connector Type: Plug; Number of Positions: 60; Gender: Male; Contact Resistance: 90mR; Pitch: 0.4mm; Stack Height: 3.5mm; Mated Stacking Heights: 4mm; Contact Pitch: 400um; Supplier 1: Digikey; Manufacturer: Hirose; Manufacturer Part Number: DF40C-60DP-0.4V(51); RoHS: Yes; Category: Headers and Wire Housings; Stock 1: 37909; Pricing 1: 1=1.29, 10=1.089, 25=1.0444, 50=1.0222, 100=0.9777, 250=0.8888, 500=0.79992, 1000=0.71104, 2500=0.64438 (USD); Mount: Surface Mount; Contact Material: Bronze; Contact Plating: Gold; Housing Material: Polymer; Housing Color: 46Colour; Min Operating Temperature: -35°C; Max Operating Temperature: 85°C; Package Quantity: 5000; Number of Rows: 2; Packaging: Tape and Reel; Termination: SMD/SMT; Number of Contacts: 60; Series: DF40; Contact Voltage Rating (AC): 30V; Contact Voltage Rating (DC): 30V; Orientation: 5491OrientationType; Length: 13.52mm; Width: 2.97mm; Height: 1.14mm; Reach SVHC Compliant: No; Lead Free: Lead Free; RoHS Compliant: Yes; ComponentLink1URL: https://datasheet.ciiva.com/46408/1824826-46408908.pdf?src-supplier=Element14; ComponentLink1Description: https://datasheet.ciiva.com/46408/1824826-46408908.pdf?src-supplier=Element14; Supplier Part Number 1: H11628CT-ND
footprint CONN_B2B_60P_HIROSE_DF40C-60DP-0.4V(51)
pins: 1, 2, 3, 4, 5, 6, 7, 8, 9, 10, 11, 12, 13, 14, 15, 16, 17, 18, 19, 20, 21, 22, 23, 24, 25, 26, 27, 28, 29, 30, 31, 32, 33, 34, 35, 36, 37, 38, 39, 40, 41, 42, 43, 44, 45, 46, 47, 48, 49, 50, 51, 52, 53, 54, 55, 56, 57, 58, 59, 60, SH, SH, SH, SH

## CONN_B2B_60P_RE_DF40C-60DS-0.4V(51)
designator J?, comment DF40C-60DS-0.4V(51)
Board-to-Board Connector with 0.4-mm Pitch, 1.5 - 4.0-mm Height - DF40 Series (HIROSE ELECTRIC); Connector Type: Receptacle; Number of Positions: 60; Current Rating: 300mA; Voltage Rating: 30V; Pitch: 0.4mm; Mated Stacking Heights: 1.5mm; Supplier 1: Digikey; Manufacturer: Hirose; Manufacturer Part Number: DF40C-60DS-0.4V(51); RoHS: Yes; Category: Headers and Wire Housings; Stock 1: 13479; Pricing 1: 1=1.29, 10=1.089, 25=1.0444, 50=1.0222, 100=0.9777, 250=0.8888, 500=0.79992, 1000=0.71104, 2500=0.64438 (USD); Mount: Surface Mount; Contact Plating: Gold; Contact Material: Bronze; Housing Material: Polymer; Package Quantity: 5000; Number of Rows: 2; Packaging: Tape and Reel; Series: DF40; Termination: SMD/SMT; Number of Contacts: 60; Gender: Receptacle; RoHS Compliant: Yes; Lead Free: Lead Free; Reach SVHC Compliant: No; ComponentLink1URL: https://datasheet.ciiva.com/46408/1824826-46408909.pdf?src-supplier=Element14; ComponentLink1Description: https://datasheet.ciiva.com/46408/1824826-46408909.pdf?src-supplier=Element14; Supplier Part Number 1: 26-DF40C-60DS-0.4V(51)CT-ND
footprint CONN_60_0P4_21P7X2P05_SM (CON_60_0P4_21P7X2P05_SM)
pins: 1, 2, 3, 4, 5, 6, 7, 8, 9, 10, 11, 12, 13, 14, 15, 16, 17, 18, 19, 20, 21, 22, 23, 24, 25, 26, 27, 28, 29, 30, 31, 32, 33, 34, 35, 36, 37, 38, 39, 40, 41, 42, 43, 44, 45, 46, 47, 48, 49, 50, 51, 52, 53, 54, 55, 56, 57, 58, 59, 60

## CONN_B2B_100P_DF40C-100DP-0.4V(51)
designator J?, comment DF40C-100DP-0.4V(51)
Board to Board & Mezzanine Connectors 100P SMT HEADER NO FITTING, NO BOSS; Manufacturer: Hirose; Voltage Rating: 30V; Current Rating: 300mA; Contact Resistance: 90mR; Connector Type: Plug; Number of Positions: 100; Gender: Male; Pitch: 0.4mm; Stack Height: 1.5mm; Mated Stacking Heights: 4mm; Supplier 1: Digikey; Manufacturer Part Number: DF40C-100DP-0.4V(51); RoHS: Yes; Category: Headers and Wire Housings; Stock 1: 16704; Pricing 1: 1=1.75, 10=1.519, 25=1.4544, 50=1.422, 100=1.3574, 250=1.22816, 500=1.1312, 1000=0.9696, 2500=0.90496 (USD); Mount: Surface Mount; Contact Material: Bronze; Contact Plating: Gold; Housing Color: Black; Housing Material: Polymer; Min Operating Temperature: -35°C; Max Operating Temperature: 85°C; Package Quantity: 5000; Number of Rows: 2; Packaging: Tape and Reel; Max Current Rating: 300mA; Termination: SMD/SMT; Max Voltage Rating (AC): 30V; Number of Contacts: 100; Orientation: Straight; Series: DF40; Length: 21.52mm; Depth: 1.85mm; Radiation Hardening: No; Reach SVHC Compliant: No; Lead Free: Lead Free; RoHS Compliant: Yes; ComponentLink1URL: https://datasheet.ciiva.com/26948/getdatasheetpartid-434445-26948932.pdf?src-supplier=Verical; ComponentLink1Description: https://datasheet.ciiva.com/26948/getdatasheetpartid-434445-26948932.pdf?src-supplier=Verical; ComponentLink2URL: https://datasheet.ciiva.com/46408/1824826-46408893.pdf?src-supplier=Element14; ComponentLink2Description: https://datasheet.ciiva.com/46408/1824826-46408893.pdf?src-supplier=Element14; Supplier Part Number 1: H11614CT-ND
footprint CONN_100_0P4_21P7X2P05_SM (CON100_0P4_21P7X2P05_SM)
pins: 1, 2, 3, 4, 5, 6, 7, 8, 9, 10, 11, 12, 13, 14, 15, 16, 17, 18, 19, 20, 21, 22, 23, 24, 25, 26, 27, 28, 29, 30, 31, 32, 33, 34, 35, 36, 37, 38, 39, 40, 41, 42, 43, 44, 45, 46, 47, 48, 49, 50, 51, 52, 53, 54, 55, 56, 57, 58, 59, 60, 61, 62, 63, 64, 65, 66, 67, 68, 69, 70, 71, 72, 73, 74, 75, 76, 77, 78, 79, 80, 81, 82, 83, 84, 85, 86, 87, 88, 89, 90, 91, 92, 93, 94, 95, 96, 97, 98, 99, 100, SH, SH, SH, SH